# Altium footprint library 数码管.PcbLib: 25 footprints (part 2 of 2)
Each footprint in its own frame and in the unit in brackets; x right, y up, seen from the top. Pads: shape width x height; smd on the part's side, far side on the other; paste and mask are expansions set on the pad; w line width, h text height; cw(c..) or ccw(c..) is an arc to the next point about the centre after c.
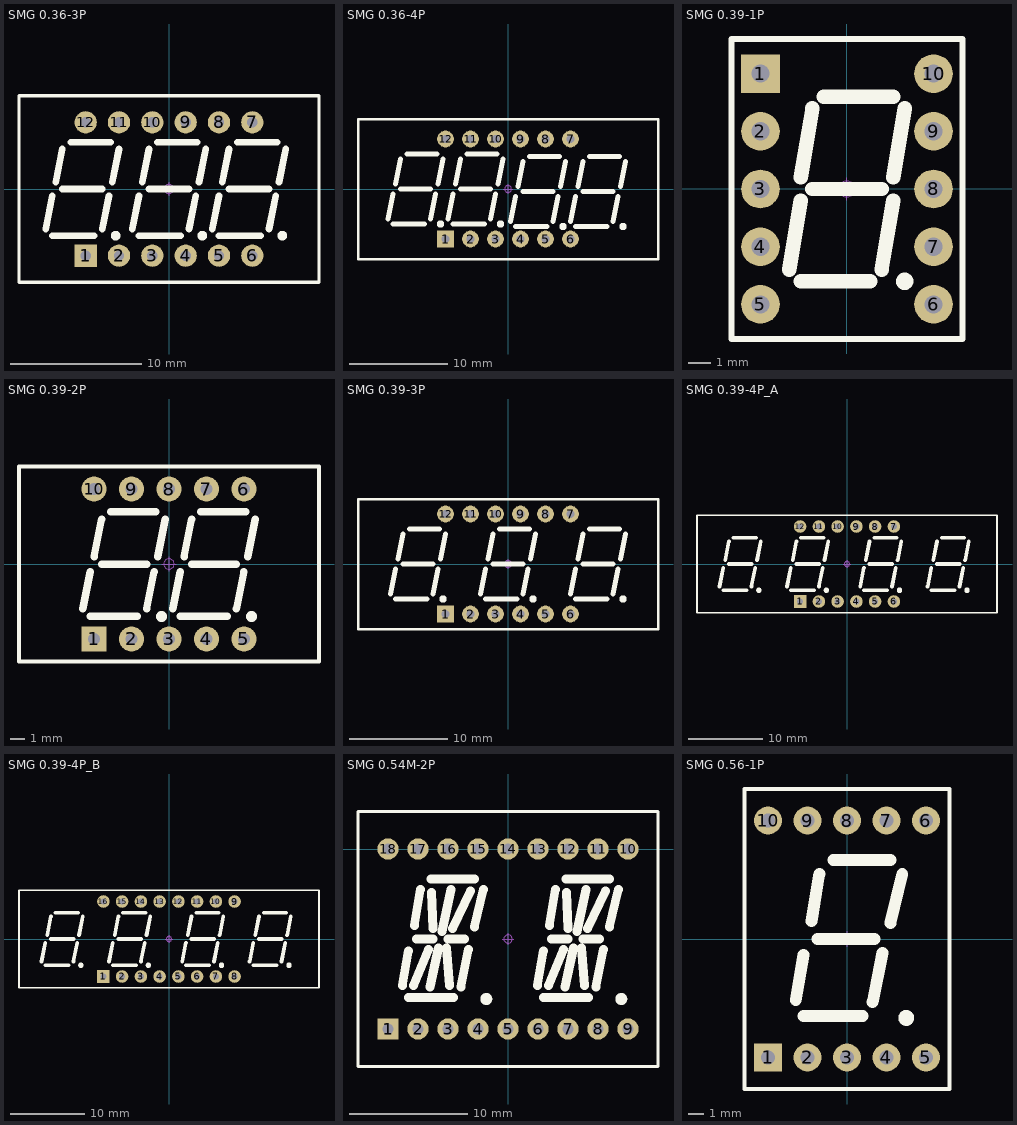
[diagram p1: the footprints below, top view; thin cyan lines are the x and y axes]

## SMG 0.36-3P [mm] "22.5*14*7.2mm(长宽厚)"
pads (12):
  rect 1.7x1.7 hole 0.8: 1(-6.35,-5.08)
  round 1.7 hole 0.8: 2(-3.81,-5.08) 3(-1.27,-5.08) 4(1.27,-5.08) 5(3.81,-5.08) 6(6.35,-5.08) 7(6.35,5.08) 8(3.81,5.08) 9(1.27,5.08) 10(-1.27,5.08) 11(-3.81,5.08) 12(-6.35,5.08)
Top Overlay:
  circle w0.381: c-4.064,-3.556 r0.18
  circle w0.381: c2.54,-3.556 r0.18
  circle w0.381: c8.636,-3.556 r0.18
  lines w0.254: -11.43,-7.112 -11.43,7.112 11.43,7.112 11.43,-7.112 -11.43,-7.112
  lines w0.508: -9.398,-3.048 -8.89,-0.508 ; -8.89,-3.556 -5.715,-3.556 ; -8.636,0.508 -8.128,3.048 ; -8.128,0 -5.08,0 ; -7.493,3.556 -4.445,3.556 ; -5.08,-3.048 -4.572,-0.508 ; -4.318,0.508 -3.81,3.048 ; -2.794,-3.048 -2.286,-0.508 ; -2.286,-3.556 0.889,-3.556 ; -2.032,0.508 -1.524,3.048 ; -0.889,3.556 2.159,3.556 ; 1.524,-3.048 2.032,-0.508 ; 2.286,0.508 2.794,3.048 ; 3.302,-3.048 3.81,-0.508 ; 3.81,-3.556 6.985,-3.556 ; 4.064,0.508 4.572,3.048 ; 5.207,3.556 8.255,3.556 ; 7.62,-3.048 8.128,-0.508 ; 8.382,0.508 8.89,3.048 ; -1.524,0 1.524,0 -1.524,0 ; 4.572,0 7.62,0 4.572,0
Mechanical 15:
  circle w0.05: c0,0 r0.35
  lines w0.05: -0.5,0 0.5,0 ; 0,-0.5 0,0.5
3D body: height 7.2, standoff -3.6, extent -11.25,-7 11.25,7

## SMG 0.36-4P [mm] "30*14*7.2mm(长宽厚)"
pads (12):
  rect 1.7x1.7 hole 0.8: 1(-6.35,-5.08)
  round 1.7 hole 0.8: 2(-3.81,-5.08) 3(-1.27,-5.08) 4(1.27,-5.08) 5(3.81,-5.08) 6(6.35,-5.08) 7(6.35,5.08) 8(3.81,5.08) 9(1.27,5.08) 10(-1.27,5.08) 11(-3.81,5.08) 12(-6.35,5.08)
Top Overlay:
  circle w0.381: c-0.762,-3.556 r0.18
  circle w0.381: c-6.858,-3.556 r0.18
  circle w0.381: c11.684,-3.81 r0.18
  circle w0.381: c5.588,-3.81 r0.18
  lines w0.254: -15.24,-7.112 15.24,-7.112 15.24,7.112 -15.24,7.112 -15.24,-7.112
  lines w0.508: -12.192,-3.048 -11.684,-0.508 ; -11.684,-3.556 -8.509,-3.556 ; -11.43,0.508 -10.922,3.048 ; -10.287,3.556 -7.239,3.556 ; -7.874,-3.048 -7.366,-0.508 ; -7.112,0.508 -6.604,3.048 ; -6.096,-3.048 -5.588,-0.508 ; -5.588,-3.556 -2.413,-3.556 ; -5.334,0.508 -4.826,3.048 ; -4.191,3.556 -1.143,3.556 ; -1.778,-3.048 -1.27,-0.508 ; -1.016,0.508 -0.508,3.048 ; 0.254,-3.302 0.762,-0.762 ; 0.762,-3.81 3.937,-3.81 ; 1.016,0.254 1.524,2.794 ; 2.159,3.302 5.207,3.302 ; 4.572,-3.302 5.08,-0.762 ; 5.334,0.254 5.842,2.794 ; 6.35,-3.302 6.858,-0.762 ; 6.858,-3.81 10.033,-3.81 ; 7.112,0.254 7.62,2.794 ; 8.255,3.302 11.303,3.302 ; 10.668,-3.302 11.176,-0.762 ; 11.43,0.254 11.938,2.794 ; -10.922,0 -7.874,0 -10.922,0 ; -4.826,0 -1.778,0 -4.826,0 ; 1.524,-0.254 4.572,-0.254 1.524,-0.254 ; 7.62,-0.254 10.668,-0.254 7.62,-0.254
Mechanical 15:
  circle w0.05: c0,0 r0.35
  lines w0.05: -0.5,0 0.5,0 ; 0,-0.5 0,0.5
3D body: height 7.2, standoff -3.6, extent -15,-7 15,7

## SMG 0.39-1P [mm] "10*13*7mm(长宽厚)"
pads (10):
  rect 1.7x1.7 hole 0.8: 1(-3.81,5.08)
  round 1.7 hole 0.8: 2(-3.81,2.54) 3(-3.81,0) 4(-3.81,-2.54) 5(-3.81,-5.08) 6(3.81,-5.08) 7(3.81,-2.54) 8(3.81,0) 9(3.81,2.54) 10(3.81,5.08)
Top Overlay:
  circle w0.508: c2.54,-4.064 r0.127
  lines w0.254: -5.08,-6.604 5.08,-6.604 5.08,6.604 -5.08,6.604 -5.08,-6.604
  lines w0.635: -2.54,-3.556 -2.032,-0.508 ; -2.032,-4.064 1.016,-4.064 ; -2.032,0.508 -1.524,3.556 ; -1.524,0 1.524,0 ; -1.016,4.064 2.032,4.064 ; 1.524,-3.556 2.032,-0.508 ; 2.032,0.508 2.54,3.556
Mechanical 15:
  circle w0.05: c0,0 r0.35
  lines w0.05: -0.5,0 0.5,0 ; 0,-0.5 0,0.5
3D body: height 7, standoff -3.6, extent -5,-6.5 5,6.5

## SMG 0.39-2P [mm] "19.9*13*7mm(长宽厚)"
pads (10):
  rect 1.7x1.7 hole 0.8: 1(-5.08,-5.08)
  round 1.7 hole 0.8: 2(-2.54,-5.08) 3(0,-5.08) 4(2.54,-5.08) 5(5.08,-5.08) 6(5.08,5.08) 7(2.54,5.08) 8(0,5.08) 9(-2.54,5.08) 10(-5.08,5.08)
Top Overlay:
  circle w0.381: c5.588,-3.556 r0.18
  circle w0.381: c-0.508,-3.556 r0.18
  lines w0.254: -10.16,-6.604 -10.16,6.604 10.16,6.604 10.16,-6.604 -10.16,-6.604
  lines w0.508: -5.842,-3.048 -5.334,-0.508 ; -5.334,-3.556 -2.159,-3.556 ; -5.08,0.508 -4.572,3.048 ; -3.937,3.556 -0.889,3.556 ; -1.524,-3.048 -1.016,-0.508 ; -0.762,0.508 -0.254,3.048 ; 0.254,-3.048 0.762,-0.508 ; 0.762,-3.556 3.937,-3.556 ; 1.016,0.508 1.524,3.048 ; 2.159,3.556 5.207,3.556 ; 4.572,-3.048 5.08,-0.508 ; 5.334,0.508 5.842,3.048 ; -4.572,0 -1.524,0 -4.572,0 ; 1.524,0 4.572,0 1.524,0
Mechanical 15:
  circle w0.05: c0,0 r0.35
  lines w0.05: -0.5,0 0.5,0 ; 0,-0.5 0,0.5
3D body: height 7, standoff -3.6, extent -9.95,-6.5 9.95,6.5

## SMG 0.39-3P [mm] "30.2*13*7mm(长宽厚)"
pads (12):
  rect 1.7x1.7 hole 0.8: 1(-6.35,-5.08)
  round 1.7 hole 0.8: 2(-3.81,-5.08) 3(-1.27,-5.08) 4(1.27,-5.08) 5(3.81,-5.08) 6(6.35,-5.08) 7(6.35,5.08) 8(3.81,5.08) 9(1.27,5.08) 10(-1.27,5.08) 11(-3.81,5.08) 12(-6.35,5.08)
Top Overlay:
  circle w0.381: c-6.604,-3.556 r0.18
  circle w0.381: c2.54,-3.556 r0.18
  circle w0.381: c11.684,-3.556 r0.18
  lines w0.254: -15.24,-6.604 -15.24,6.604 15.24,6.604 15.24,-6.604 -15.24,-6.604
  lines w0.508: -11.938,-3.048 -11.43,-0.508 ; -11.43,-3.556 -8.255,-3.556 ; -11.176,0.508 -10.668,3.048 ; -10.668,0 -7.62,0 ; -10.033,3.556 -6.985,3.556 ; -7.62,-3.048 -7.112,-0.508 ; -6.858,0.508 -6.35,3.048 ; -2.794,-3.048 -2.286,-0.508 ; -2.286,-3.556 0.889,-3.556 ; -2.032,0.508 -1.524,3.048 ; -0.889,3.556 2.159,3.556 ; 1.524,-3.048 2.032,-0.508 ; 2.286,0.508 2.794,3.048 ; 6.35,-3.048 6.858,-0.508 ; 6.858,-3.556 10.033,-3.556 ; 7.112,0.508 7.62,3.048 ; 8.255,3.556 11.303,3.556 ; 10.668,-3.048 11.176,-0.508 ; 11.43,0.508 11.938,3.048 ; -1.524,0 1.524,0 -1.524,0 ; 7.62,0 10.668,0 7.62,0
Mechanical 15:
  circle w0.05: c0,0 r0.35
  lines w0.05: -0.5,0 0.5,0 ; 0,-0.5 0,0.5
3D body: height 7, standoff -3.6, extent -15.01,-6.5 15.01,6.5

## SMG 0.39-4P_A [mm] "40.2*13*7mm(长宽厚)"
pads (12):
  rect 1.7x1.7 hole 0.8: 1(-6.35,-5.08)
  round 1.7 hole 0.8: 2(-3.81,-5.08) 3(-1.27,-5.08) 4(1.27,-5.08) 5(3.81,-5.08) 6(6.35,-5.08) 7(6.35,5.08) 8(3.81,5.08) 9(1.27,5.08) 10(-1.27,5.08) 11(-3.81,5.08) 12(-6.35,5.08)
Top Overlay:
  circle w0.381: c7.112,-3.556 r0.18
  circle w0.381: c16.256,-3.556 r0.18
  circle w0.381: c-11.938,-3.556 r0.18
  circle w0.381: c-2.794,-3.556 r0.18
  lines w0.254: -20.32,-6.604 20.32,-6.604 20.32,6.604 -20.32,6.604 -20.32,-6.604
  lines w0.508: -17.272,-3.048 -16.764,-0.508 ; -16.764,-3.556 -13.589,-3.556 ; -16.51,0.508 -16.002,3.048 ; -16.002,0 -12.954,0 ; -15.367,3.556 -12.319,3.556 ; -12.954,-3.048 -12.446,-0.508 ; -12.192,0.508 -11.684,3.048 ; -8.128,-3.048 -7.62,-0.508 ; -7.62,-3.556 -4.445,-3.556 ; -7.366,0.508 -6.858,3.048 ; -6.223,3.556 -3.175,3.556 ; -3.81,-3.048 -3.302,-0.508 ; -3.048,0.508 -2.54,3.048 ; 1.778,-3.048 2.286,-0.508 ; 2.286,-3.556 5.461,-3.556 ; 2.54,0.508 3.048,3.048 ; 3.048,0 6.096,0 ; 3.683,3.556 6.731,3.556 ; 6.096,-3.048 6.604,-0.508 ; 6.858,0.508 7.366,3.048 ; 10.922,-3.048 11.43,-0.508 ; 11.43,-3.556 14.605,-3.556 ; 11.684,0.508 12.192,3.048 ; 12.827,3.556 15.875,3.556 ; 15.24,-3.048 15.748,-0.508 ; 16.002,0.508 16.51,3.048 ; -6.858,0 -3.81,0 -6.858,0 ; 12.192,0 15.24,0 12.192,0
Mechanical 15:
  circle w0.05: c0,0 r0.35
  lines w0.05: -0.5,0 0.5,0 ; 0,-0.5 0,0.5
3D body: height 7, standoff -3.6, extent -20.09,-6.5 20.09,6.5

## SMG 0.39-4P_B [mm] "40.2*13*7mm(长宽厚) 时钟型"
pads (16):
  rect 1.7x1.7 hole 0.8: 1(-8.89,-5.08)
  round 1.7 hole 0.8: 2(-6.35,-5.08) 3(-3.81,-5.08) 4(-1.27,-5.08) 5(1.27,-5.08) 6(3.81,-5.08) 7(6.35,-5.08) 8(8.89,-5.08) 9(8.89,5.08) 10(6.35,5.08) 11(3.81,5.08) 12(1.27,5.08) 13(-1.27,5.08) 14(-3.81,5.08) 15(-6.35,5.08) 16(-8.89,5.08)
Top Overlay:
  circle w0.381: c-2.794,-3.556 r0.18
  circle w0.381: c-11.938,-3.556 r0.18
  circle w0.381: c16.256,-3.556 r0.18
  circle w0.381: c7.112,-3.556 r0.18
  lines w0.254: -20.32,-6.604 -20.32,6.604 20.32,6.604 20.32,-6.604 -20.32,-6.604
  lines w0.508: -17.272,-3.048 -16.764,-0.508 ; -16.764,-3.556 -13.589,-3.556 ; -16.51,0.508 -16.002,3.048 ; -16.002,0 -12.954,0 ; -15.367,3.556 -12.319,3.556 ; -12.954,-3.048 -12.446,-0.508 ; -12.192,0.508 -11.684,3.048 ; -8.128,-3.048 -7.62,-0.508 ; -7.62,-3.556 -4.445,-3.556 ; -7.366,0.508 -6.858,3.048 ; -6.223,3.556 -3.175,3.556 ; -3.81,-3.048 -3.302,-0.508 ; -3.048,0.508 -2.54,3.048 ; 1.778,-3.048 2.286,-0.508 ; 2.286,-3.556 5.461,-3.556 ; 2.54,0.508 3.048,3.048 ; 3.048,0 6.096,0 ; 3.683,3.556 6.731,3.556 ; 6.096,-3.048 6.604,-0.508 ; 6.858,0.508 7.366,3.048 ; 10.922,-3.048 11.43,-0.508 ; 11.43,-3.556 14.605,-3.556 ; 11.684,0.508 12.192,3.048 ; 12.827,3.556 15.875,3.556 ; 15.24,-3.048 15.748,-0.508 ; 16.002,0.508 16.51,3.048 ; -6.858,0 -3.81,0 -6.858,0 ; 12.192,0 15.24,0 12.192,0
Mechanical 15:
  circle w0.05: c0,0 r0.35
  lines w0.05: -0.5,0 0.5,0 ; 0,-0.5 0,0.5
3D body: height 7, standoff -3.6, extent -20.09,-6.5 20.09,6.5

## SMG 0.54M-2P [mm] "25*21.2*8mm(长宽厚)"
pads (18):
  rect 1.8x1.8 hole 0.9: 1(-10.16,-15.24)
  round 1.8 hole 0.9: 2(-7.62,-15.24) 3(-5.08,-15.24) 4(-2.54,-15.24) 5(0,-15.24) 6(2.54,-15.24) 7(5.08,-15.24) 8(7.62,-15.24) 9(10.16,-15.24) 10(10.16,0)
  round 1.8 hole 0.9 unplated: 11(7.62,0) 12(5.08,0) 13(2.54,0) 14(0,0) 15(-2.54,0) 16(-5.08,0) 17(-7.62,0) 18(-10.16,0)
Top Overlay:
  circle w0.508: c9.588,-12.7 r0.254
  circle w0.508: c-1.841,-12.7 r0.254
  lines w0.254: -12.7,-18.415 12.7,-18.415 12.7,3.175 -12.7,3.175 -12.7,-18.415
  lines w0.762: -8.954,-11.557 -8.445,-8.636 ; -8.445,-12.573 -4.635,-12.573 ; -8.001,-11.557 -6.731,-8.509 ; -7.938,-6.477 -7.429,-3.429 ; -7.747,-7.62 -6.35,-7.62 ; -6.604,-11.684 -5.894,-8.371 ; -6.54,-2.54 -2.857,-2.54 ; -6.477,-3.683 -6.35,-6.731 ; -5.588,-6.985 -4.826,-3.429 ; -5.207,-8.382 -4.953,-11.557 ; -5.08,-7.62 -3.683,-7.62 ; -4.699,-6.731 -3.175,-3.556 ; -4,-11.684 -3.365,-8.509 ; -2.857,-6.604 -2.095,-3.429 ; 2.476,-11.557 2.984,-8.636 ; 2.984,-12.573 6.794,-12.573 ; 3.429,-11.557 4.699,-8.509 ; 3.492,-6.477 4,-3.429 ; 3.683,-7.62 5.08,-7.62 ; 4.826,-11.684 5.536,-8.371 ; 4.889,-2.54 8.572,-2.54 ; 4.953,-3.683 5.08,-6.731 ; 5.842,-6.985 6.604,-3.429 ; 6.223,-8.382 6.477,-11.557 ; 6.35,-7.62 7.747,-7.62 ; 6.731,-6.731 8.255,-3.556 ; 7.429,-11.684 8.064,-8.509 ; 8.572,-6.604 9.335,-3.429
Mechanical 15:
  circle w0.05: c0,-7.62 r0.35
  lines w0.05: -0.5,-7.62 0.5,-7.62 ; 0,-8.12 0,-7.12
3D body: height 8.2, standoff -3, extent -12.5,-18.22 12.5,2.98

## SMG 0.56-1P [mm] "12.7*19*8mm(长宽厚)"
pads (10):
  rect 1.8x1.8 hole 0.9: 1(-5.08,-7.62)
  round 1.8 hole 0.9: 2(-2.54,-7.62) 3(0,-7.62) 4(2.54,-7.62) 5(5.08,-7.62) 6(5.08,7.62) 7(2.54,7.62) 8(0,7.62) 9(-2.54,7.62) 10(-5.08,7.62)
Top Overlay:
  circle w0.508: c3.81,-5.08 r0.254
  lines w0.254: -6.604,-9.652 6.604,-9.652 6.604,9.652 -6.604,9.652 -6.604,-9.652
  lines w0.762: -3.302,-3.937 -2.794,-1.016 ; -2.794,-4.953 1.016,-4.953 ; -2.286,1.143 -1.778,4.191 ; -1.905,0 1.778,0 ; -0.889,5.08 2.794,5.08 ; 1.651,-4.064 2.286,-0.889 ; 2.794,1.016 3.556,4.191
Mechanical 15:
  circle w0.05: c0,0 r0.35
  lines w0.05: -0.5,0 0.5,0 ; 0,-0.5 0,0.5
3D body: height 8, standoff -3.6, extent -6.3,-9.5 6.3,9.5